# Altium footprint library 1.27贴片排针.PcbLib: 20 footprints (part 1 of 2)
Each footprint in its own frame and in the unit in brackets; x right, y up, seen from the top. Pads: shape width x height; smd on the part's side, far side on the other; paste and mask are expansions set on the pad; w line width, h text height; cw(c..) or ccw(c..) is an arc to the next point about the centre after c.
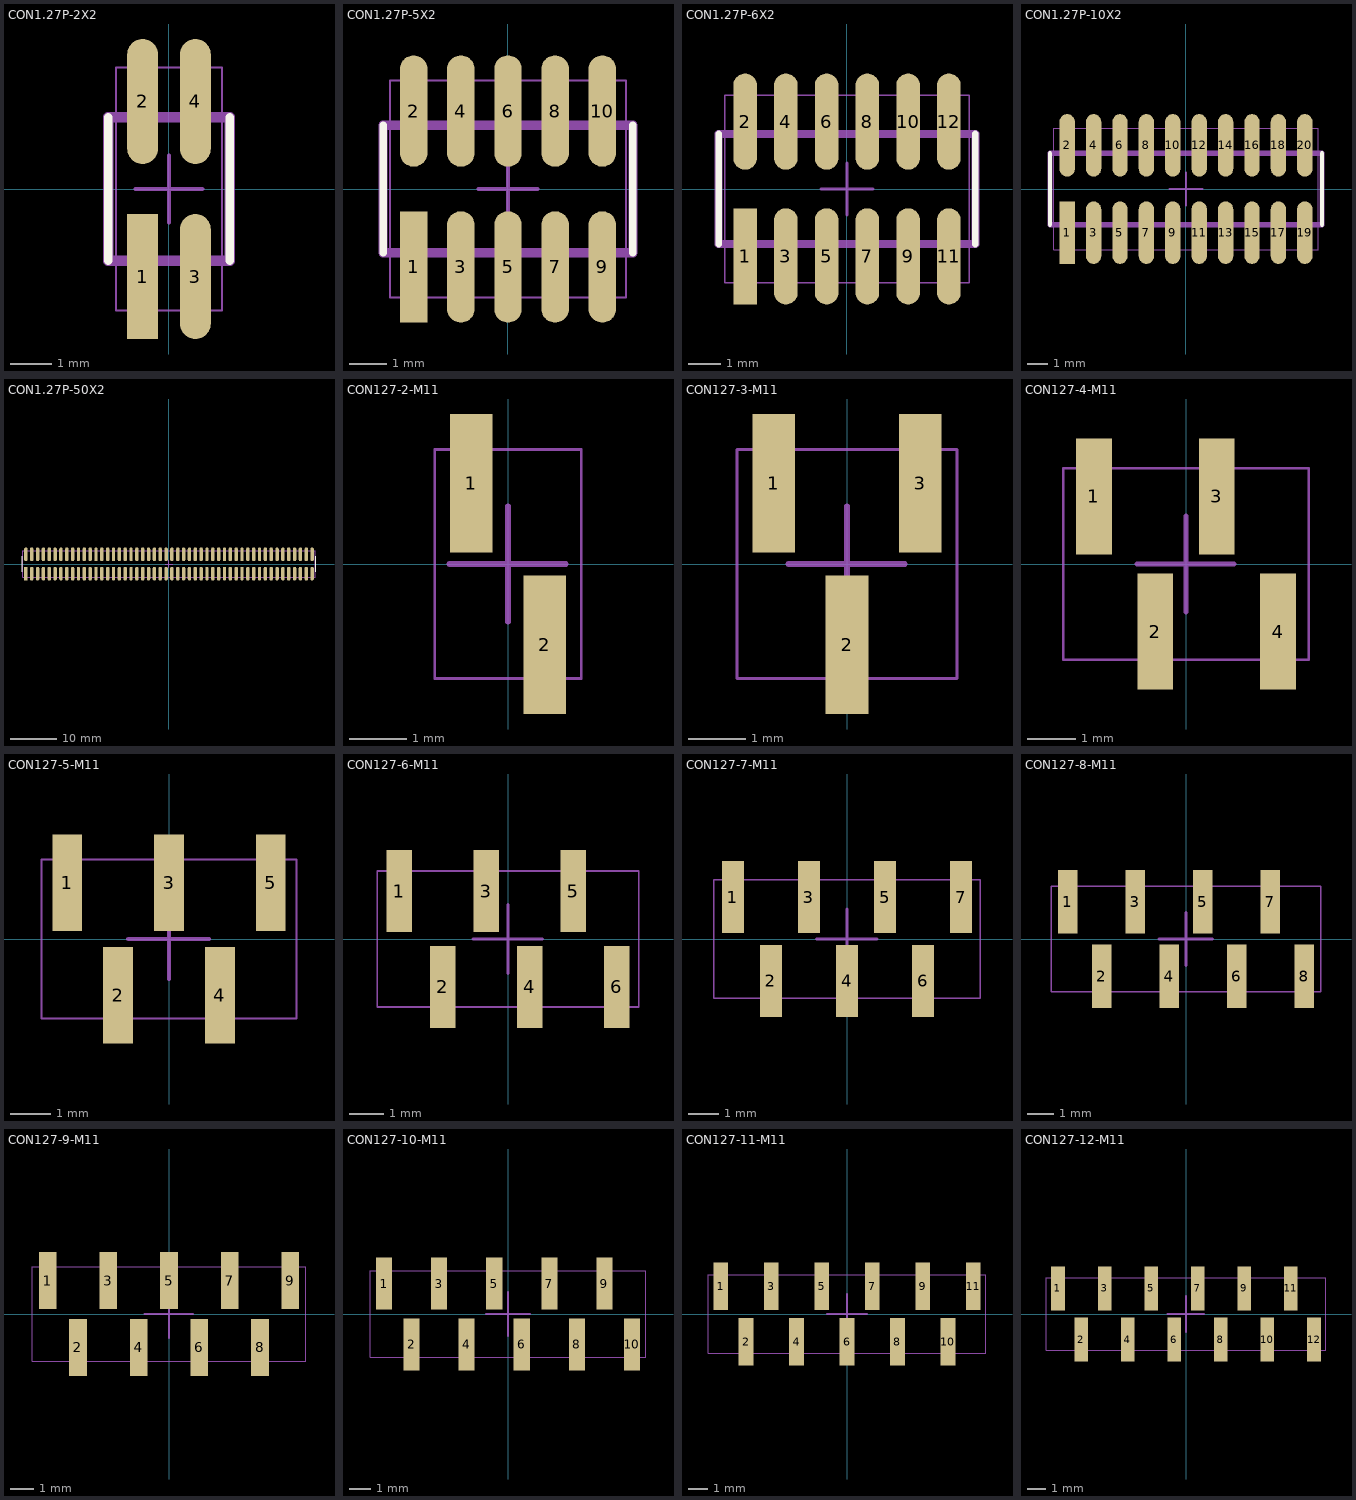
[diagram p0: the footprints below, top view; thin cyan lines are the x and y axes]

## CON1.27P-2X2 [mm] "贴片双排针 1.27mm 脚距"
height 3.4
pads (4):
  rect 0.74x3 smd: 1(-0.635,-2.1)
  oval 0.74x3 smd: 2(-0.635,2.1) 3(0.635,-2.1) 4(0.635,2.1)
Top Overlay:
  lines w0.2: -1.46,-1.72 -1.46,1.72 ; 1.46,-1.72 1.46,1.72
Mechanical 13:
  lines w0.05: -1.27,-2.921 1.27,-2.921 1.27,2.919 -1.27,2.919 -1.27,-2.921
Mechanical 15:
  lines w0.1: -0.8,0 0.8,0 ; 0,-0.8 0,0.8
  lines w0.25: -1.46,-1.72 -1.46,1.72 1.46,1.72 1.46,-1.72 -1.46,-1.72
3D body: height 4.9, standoff 0, extent -1.27,-2.92 1.27,2.92

## CON1.27P-5X2 [mm] "贴片双排针 1.27mm 脚距"
height 3.4
pads (10):
  rect 0.74x3 smd: 1(-2.54,-2.1)
  oval 0.74x3 smd: 2(-2.54,2.1) 3(-1.27,-2.1) 4(-1.27,2.1) 5(0,-2.1) 6(0,2.1) 7(1.27,-2.1) 8(1.27,2.1) 9(2.54,-2.1) 10(2.54,2.1)
Top Overlay:
  lines w0.2: -3.365,-1.72 -3.365,1.72 ; 3.365,-1.72 3.365,1.72
Mechanical 13:
  lines w0.05: -3.175,-2.921 -3.175,2.919 3.175,2.919 3.175,-2.921 -3.175,-2.921
Mechanical 15:
  lines w0.1: -0.8,0 0.8,0 ; 0,-0.8 0,0.8
  lines w0.25: -3.365,-1.72 3.365,-1.72 3.365,1.72 -3.365,1.72 -3.365,-1.72
3D body: height 4.9, standoff 0, extent -3.175,-2.92 3.175,2.92

## CON1.27P-6X2 [mm] "贴片双排针 1.27mm 脚距"
height 3.4
pads (12):
  rect 0.74x3 smd: 1(-3.175,-2.1)
  oval 0.74x3 smd: 2(-3.175,2.1) 3(-1.905,-2.1) 4(-1.905,2.1) 5(-0.635,-2.1) 6(-0.635,2.1) 7(0.635,-2.1) 8(0.635,2.1) 9(1.905,-2.1) 10(1.905,2.1) 11(3.175,-2.1) 12(3.175,2.1)
Top Overlay:
  lines w0.2: -4,-1.72 -4,1.72 ; 4,-1.72 4,1.72
Mechanical 13:
  lines w0.05: -3.81,-2.921 3.81,-2.921 3.81,2.919 -3.81,2.919 -3.81,-2.921
Mechanical 15:
  lines w0.1: -0.8,0 0.8,0 ; 0,-0.8 0,0.8
  lines w0.25: -4,-1.72 -4,1.72 4,1.72 4,-1.72 -4,-1.72
3D body: height 4.9, standoff 0, extent -3.81,-2.92 3.81,2.92

## CON1.27P-10X2 [mm] "贴片双排针 1.27mm 脚距"
height 3.4
pads (20):
  rect 0.74x3 smd: 1(-5.715,-2.1)
  oval 0.74x3 smd: 2(-5.715,2.1) 3(-4.445,-2.1) 4(-4.445,2.1) 5(-3.175,-2.1) 6(-3.175,2.1) 7(-1.905,-2.1) 8(-1.905,2.1) 9(-0.635,-2.1) 10(-0.635,2.1) 11(0.635,-2.1) 12(0.635,2.1) 13(1.905,-2.1) 14(1.905,2.1) 15(3.175,-2.1) 16(3.175,2.1) 17(4.445,-2.1) 18(4.445,2.1) 19(5.715,-2.1) 20(5.715,2.1)
Top Overlay:
  lines w0.2: -6.54,-1.72 -6.54,1.72 ; 6.54,-1.72 6.54,1.72
Mechanical 13:
  lines w0.05: -6.35,-2.921 6.35,-2.921 6.35,2.919 -6.35,2.919 -6.35,-2.921
Mechanical 15:
  lines w0.1: -0.8,0 0.8,0 ; 0,-0.8 0,0.8
  lines w0.25: -6.54,-1.72 -6.54,1.72 6.54,1.72 6.54,-1.72 -6.54,-1.72
3D body: height 4.9, standoff -0.9, extent -6.35,-2.921 6.35,2.919

## CON1.27P-50X2 [mm] "贴片双排针 1.27mm 脚距"
height 3.4
pads (100):
  rect 0.74x3 smd: 1(-31.115,-2.1)
  oval 0.74x3 smd: 2(-31.115,2.1) 3(-29.845,-2.1) 4(-29.845,2.1) 5(-28.575,-2.1) 6(-28.575,2.1) 7(-27.305,-2.1) 8(-27.305,2.1) 9(-26.035,-2.1) 10(-26.035,2.1) 11(-24.765,-2.1) 12(-24.765,2.1) 13(-23.495,-2.1) 14(-23.495,2.1) 15(-22.225,-2.1) 16(-22.225,2.1) 17(-20.955,-2.1) 18(-20.955,2.1) 19(-19.685,-2.1) 20(-19.685,2.1) 21(-18.415,-2.1) 22(-18.415,2.1) 23(-17.145,-2.1) 24(-17.145,2.1) 25(-15.875,-2.1) 26(-15.875,2.1) 27(-14.605,-2.1) 28(-14.605,2.1) 29(-13.335,-2.1) 30(-13.335,2.1) 31(-12.065,-2.1) 32(-12.065,2.1) 33(-10.795,-2.1) 34(-10.795,2.1) 35(-9.525,-2.1) 36(-9.525,2.1) 37(-8.255,-2.1) 38(-8.255,2.1) 39(-6.985,-2.1) 40(-6.985,2.1) 41(-5.715,-2.1) 42(-5.715,2.1) 43(-4.445,-2.1) 44(-4.445,2.1) 45(-3.175,-2.1) 46(-3.175,2.1) 47(-1.905,-2.1) 48(-1.905,2.1) 49(-0.635,-2.1) 50(-0.635,2.1) 51(0.635,-2.1) 52(0.635,2.1) 53(1.905,-2.1) 54(1.905,2.1) 55(3.175,-2.1) 56(3.175,2.1) 57(4.445,-2.1) 58(4.445,2.1) 59(5.715,-2.1) 60(5.715,2.1) 61(6.985,-2.1) 62(6.985,2.1) 63(8.255,-2.1) 64(8.255,2.1) 65(9.525,-2.1) 66(9.525,2.1) 67(10.795,-2.1) 68(10.795,2.1) 69(12.065,-2.1) 70(12.065,2.1) 71(13.335,-2.1) 72(13.335,2.1) 73(14.605,-2.1) 74(14.605,2.1) 75(15.875,-2.1) 76(15.875,2.1) 77(17.145,-2.1) 78(17.145,2.1) 79(18.415,-2.1) 80(18.415,2.1) 81(19.685,-2.1) 82(19.685,2.1) 83(20.955,-2.1) 84(20.955,2.1) 85(22.225,-2.1) 86(22.225,2.1) 87(23.495,-2.1) 88(23.495,2.1) 89(24.765,-2.1) 90(24.765,2.1) 91(26.035,-2.1) 92(26.035,2.1) 93(27.305,-2.1) 94(27.305,2.1) 95(28.575,-2.1) 96(28.575,2.1) 97(29.845,-2.1) 98(29.845,2.1) 99(31.115,-2.1) 100(31.115,2.1)
Top Overlay:
  lines w0.2: -31.94,-1.72 -31.94,1.72 ; 31.94,-1.72 31.94,1.72
Mechanical 13:
  lines w0.05: -31.75,-2.921 -31.75,2.919 31.75,2.919 31.75,-2.921 -31.75,-2.921
Mechanical 15:
  lines w0.1: -0.8,0 0.8,0 ; 0,-0.8 0,0.8
  lines w0.25: 31.94,-1.72 31.94,1.72
3D body: height 4.9, standoff 0, extent -31.75,-2.921 31.75,2.919

## CON127-2-M11 [mm] "1.27mm脚距，排针。联益康电子"
height 5
pads (2):
  rect 0.74x2.4 smd: 1(-0.635,1.4) 2(0.635,-1.4)
Mechanical 13:
  lines w0.05: -1.27,-1.985 1.27,-1.985 1.27,1.985 -1.27,1.985 -1.27,-1.985
Mechanical 15:
  lines w0.1: -1.016,0 1,0 ; 0,-1 0,1
3D body: height 5.3, standoff 0.04, extent -1.27,-1.985 1.27,1.985

## CON127-3-M11 [mm] "1.27mm脚距，排针。联益康电子"
height 5
pads (3):
  rect 0.74x2.4 smd: 1(-1.27,1.4) 2(0,-1.4) 3(1.27,1.4)
Mechanical 13:
  lines w0.05: -1.905,-1.985 1.905,-1.985 1.905,1.985 -1.905,1.985 -1.905,-1.985
Mechanical 15:
  lines w0.1: -1.016,0 1,0 ; 0,-1 0,1
3D body: height 5.3, standoff 0.04, extent -1.905,-1.985 1.905,1.985

## CON127-4-M11 [mm] "1.27mm脚距，排针。联益康电子"
height 5
pads (4):
  rect 0.74x2.4 smd: 1(-1.905,1.4) 2(-0.635,-1.4) 3(0.635,1.4) 4(1.905,-1.4)
Mechanical 13:
  lines w0.05: -2.54,-1.985 -2.54,1.985 2.54,1.985 2.54,-1.985 -2.54,-1.985
Mechanical 15:
  lines w0.1: -1.016,0 1,0 ; 0,-1 0,1
3D body: height 5.3, standoff 0.04, extent -2.54,-1.985 2.54,1.985

## CON127-5-M11 [mm] "1.27mm脚距，排针。联益康电子"
height 5
pads (5):
  rect 0.74x2.4 smd: 1(-2.54,1.4) 2(-1.27,-1.4) 3(0,1.4) 4(1.27,-1.4) 5(2.54,1.4)
Mechanical 13:
  lines w0.05: -3.175,-1.985 -3.175,1.985 3.175,1.985 3.175,-1.985 -3.175,-1.985
Mechanical 15:
  lines w0.1: -1.016,0 1,0 ; 0,-1 0,1
3D body: height 5.3, standoff 0.04, extent -3.175,-1.985 3.175,1.985

## CON127-6-M11 [mm] "1.27mm脚距，排针。联益康电子"
height 5
pads (6):
  rect 0.74x2.4 smd: 1(-3.175,1.4) 2(-1.905,-1.4) 3(-0.635,1.4) 4(0.635,-1.4) 5(1.905,1.4) 6(3.175,-1.4)
Mechanical 13:
  lines w0.05: -3.81,-1.985 3.81,-1.985 3.81,1.985 -3.81,1.985 -3.81,-1.985
Mechanical 15:
  lines w0.1: -1.016,0 1,0 ; 0,-1 0,1
3D body: height 5.3, standoff 0.04, extent -3.81,-1.985 3.81,1.985

## CON127-7-M11 [mm] "1.27mm脚距，排针。联益康电子"
height 5
pads (7):
  rect 0.74x2.4 smd: 1(-3.81,1.4) 2(-2.54,-1.4) 3(-1.27,1.4) 4(0,-1.4) 5(1.27,1.4) 6(2.54,-1.4) 7(3.81,1.4)
Mechanical 13:
  lines w0.05: -4.445,-1.985 4.445,-1.985 4.445,1.985 -4.445,1.985 -4.445,-1.985
Mechanical 15:
  lines w0.1: -1.016,0 1,0 ; 0,-1 0,1
3D body: height 5.3, standoff 0.04, extent -4.445,-1.985 4.445,1.985

## CON127-8-M11 [mm] "1.27mm脚距，排针。联益康电子"
height 5
pads (8):
  rect 0.74x2.4 smd: 1(-4.445,1.4) 2(-3.175,-1.4) 3(-1.905,1.4) 4(-0.635,-1.4) 5(0.635,1.4) 6(1.905,-1.4) 7(3.175,1.4) 8(4.445,-1.4)
Mechanical 13:
  lines w0.05: -5.08,-1.985 5.08,-1.985 5.08,1.985 -5.08,1.985 -5.08,-1.985
Mechanical 15:
  lines w0.1: -1.016,0 1,0 ; 0,-1 0,1
3D body: height 5.3, standoff 0.04, extent -5.08,-1.985 5.08,1.985

## CON127-9-M11 [mm] "1.27mm脚距，排针。联益康电子"
height 5
pads (9):
  rect 0.74x2.4 smd: 1(-5.08,1.4) 2(-3.81,-1.4) 3(-2.54,1.4) 4(-1.27,-1.4) 5(0,1.4) 6(1.27,-1.4) 7(2.54,1.4) 8(3.81,-1.4) 9(5.08,1.4)
Mechanical 13:
  lines w0.05: -5.715,-1.985 5.715,-1.985 5.715,1.985 -5.715,1.985 -5.715,-1.985
Mechanical 15:
  lines w0.1: -1.016,0 1,0 ; 0,-1 0,1
3D body: height 5.3, standoff 0.04, extent -5.715,-1.985 5.715,1.985

## CON127-10-M11 [mm] "1.27mm脚距，排针。联益康电子"
height 5
pads (10):
  rect 0.74x2.4 smd: 1(-5.715,1.4) 2(-4.445,-1.4) 3(-3.175,1.4) 4(-1.905,-1.4) 5(-0.635,1.4) 6(0.635,-1.4) 7(1.905,1.4) 8(3.175,-1.4) 9(4.445,1.4) 10(5.715,-1.4)
Mechanical 13:
  lines w0.05: -6.35,-1.985 -6.35,1.985 6.35,1.985 6.35,-1.985 -6.35,-1.985
Mechanical 15:
  lines w0.1: -1.016,0 1,0 ; 0,-1 0,1
3D body: height 5.3, standoff 0.04, extent -6.35,-1.985 6.35,1.985

## CON127-11-M11 [mm] "1.27mm脚距，排针。联益康电子"
height 5
pads (11):
  rect 0.74x2.4 smd: 1(-6.35,1.4) 2(-5.08,-1.4) 3(-3.81,1.4) 4(-2.54,-1.4) 5(-1.27,1.4) 6(0,-1.4) 7(1.27,1.4) 8(2.54,-1.4) 9(3.81,1.4) 10(5.08,-1.4) 11(6.35,1.4)
Mechanical 13:
  lines w0.05: -6.985,-1.985 6.985,-1.985 6.985,1.985 -6.985,1.985 -6.985,-1.985
Mechanical 15:
  lines w0.1: -1.016,0 1,0 ; 0,-1 0,1
3D body: height 5.3, standoff 0.04, extent -6.985,-1.985 6.985,1.985

## CON127-12-M11 [mm] "1.27mm脚距，排针。联益康电子"
height 5
pads (12):
  rect 0.74x2.4 smd: 1(-6.985,1.4) 2(-5.715,-1.4) 3(-4.445,1.4) 4(-3.175,-1.4) 5(-1.905,1.4) 6(-0.635,-1.4) 7(0.635,1.4) 8(1.905,-1.4) 9(3.175,1.4) 10(4.445,-1.4) 11(5.715,1.4) 12(6.985,-1.4)
Mechanical 13:
  lines w0.05: -7.62,-1.985 -7.62,1.985 7.62,1.985 7.62,-1.985 -7.62,-1.985
Mechanical 15:
  lines w0.1: -1.016,0 1,0 ; 0,-1 0,1
3D body: height 5.3, standoff 0.04, extent -7.62,-1.985 7.62,1.985